# Altium footprint library PcbLib1.PcbLib: 120 footprints (part 2 of 8)
Each footprint in its own frame and in the unit in brackets; x right, y up, seen from the top. Pads: shape width x height; smd on the part's side, far side on the other; paste and mask are expansions set on the pad; w line width, h text height; cw(c..) or ccw(c..) is an arc to the next point about the centre after c.
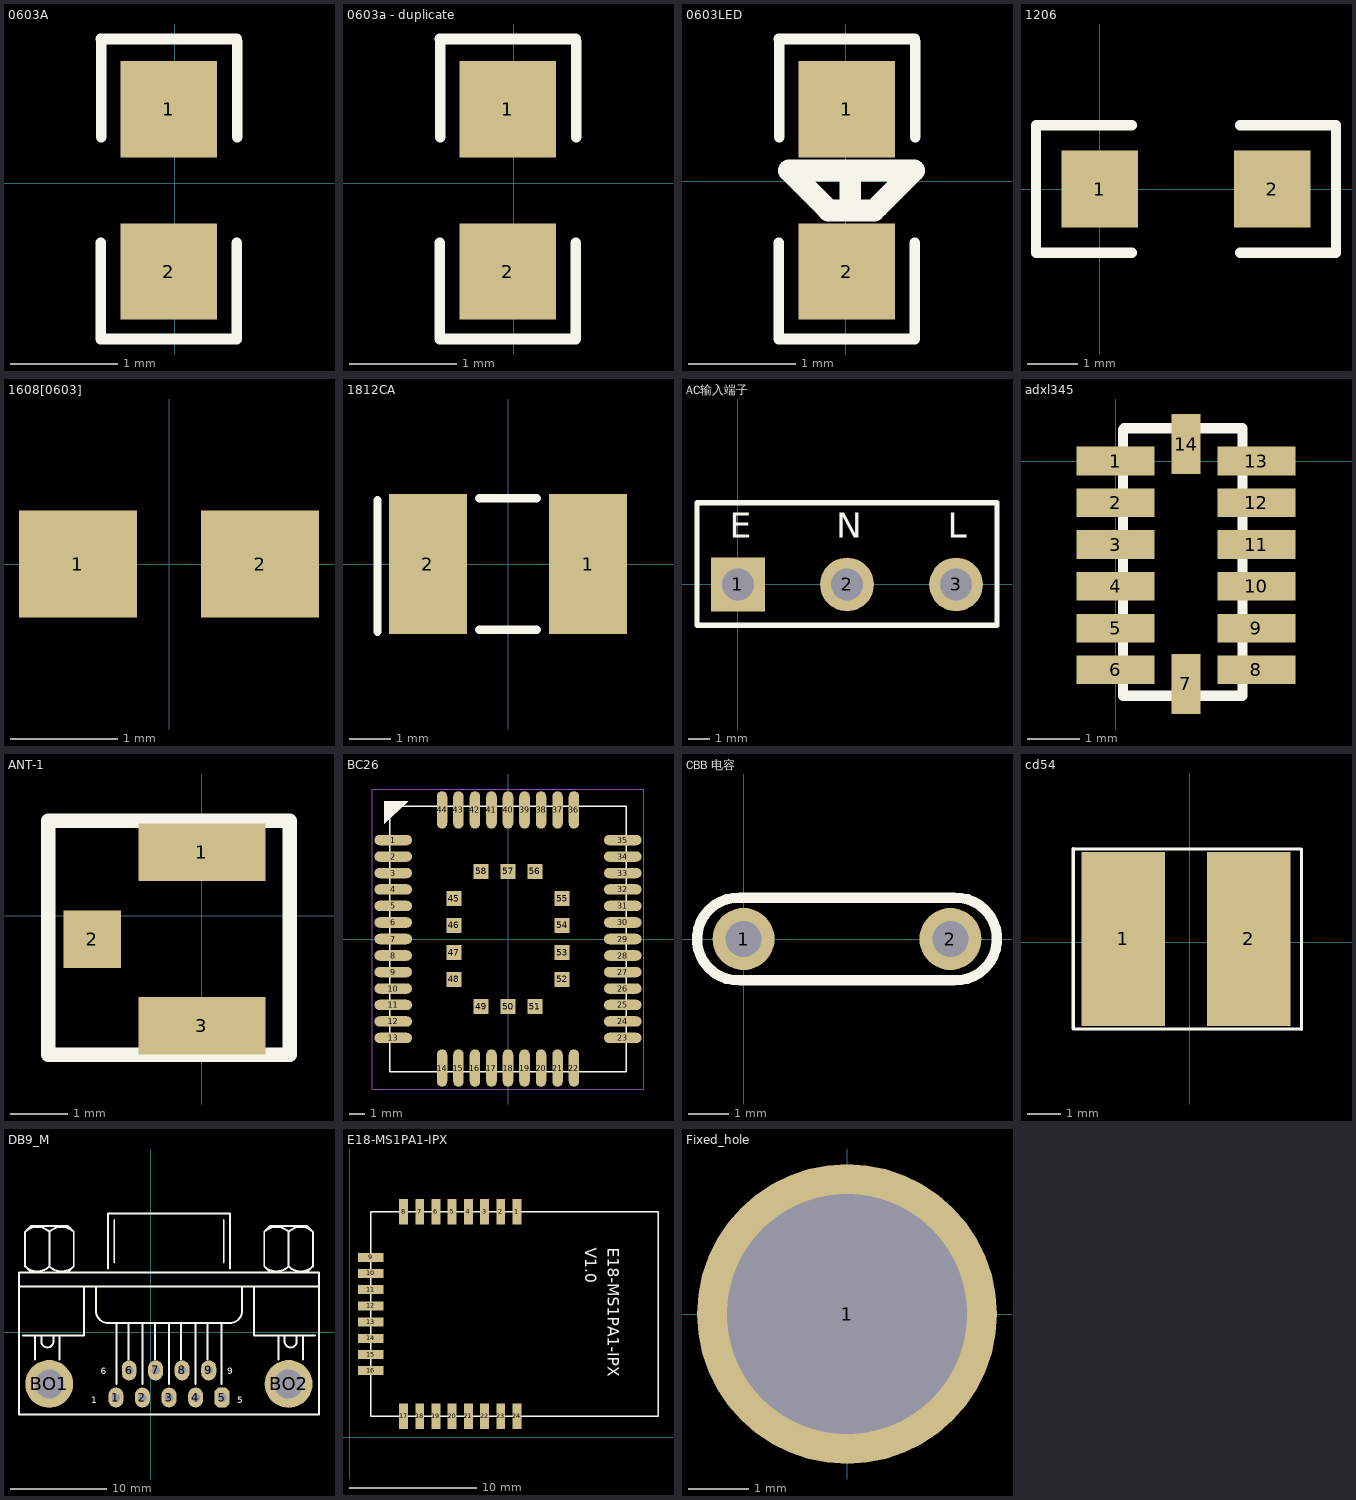
[diagram p1: the footprints below, top view; thin cyan lines are the x and y axes]

## 36W双组输出模块 - duplicate [mm]

## 0603A [mm]
pads (2):
  rect 0.9x0.9 smd: 1(-0.058,0.688) 2(-0.058,-0.826)
Top Overlay:
  lines w0.1: -0.693,-1.446 -0.693,-0.557 ; -0.693,-1.457 0.577,-1.457 ; -0.692,1.345 0.578,1.345 ; -0.689,0.43 -0.689,1.319 ; 0.577,-1.45 0.577,-0.561 ; 0.582,0.43 0.582,1.319

## 0603a - duplicate [mm]
pads (2):
  rect 0.9x0.9 smd: 1(-0.058,0.688) 2(-0.058,-0.826)
Top Overlay:
  lines w0.1: -0.693,-1.446 -0.693,-0.557 ; -0.693,-1.457 0.577,-1.457 ; -0.692,1.345 0.578,1.345 ; -0.689,0.43 -0.689,1.319 ; 0.577,-1.45 0.577,-0.561 ; 0.582,0.43 0.582,1.319

## 0603LED [mm]
pads (2):
  rect 0.9x0.9 smd: 1(0.009,0.673) 2(0.009,-0.842)
Top Overlay:
  lines w0.1: -0.626,-1.462 -0.626,-0.573 ; -0.625,-1.472 0.645,-1.472 ; -0.625,1.329 0.645,1.329 ; -0.621,0.414 -0.621,1.303 ; 0.645,-1.465 0.645,-0.576 ; 0.649,0.414 0.649,1.303
  lines w0.203: -0.175,-0.257 -0.533,0.102 0.639,0.102 0.303,-0.234 ; -0.164,-0.272 0.266,-0.272 ; 0.041,-0.196 0.041,0.023

## 1206 [mil]
pads (2):
  rect 60x60 smd: 1(0,0) 2(135,0)
Top Overlay:
  lines w8: 25,-50 -50,-50 -50,50 25,50 ; 110,-50 185,-50 185,50 110,50

## 1608[0603] [mm] "Chip Capacitor; Body 1.6 x 0.8 mm (LxW typ)"
height 1.35
pads (2):
  rect 1.1x1 smd: 1(-0.85,0) 2(0.85,0)

## 1812CA [mm]
height 1.1
pads (2):
  rect 1.9x3.4 smd: 1(1.95,0) 2(-1.95,0)
Top Overlay:
  lines w0.2: -3.175,-1.651 -3.175,1.549 ; -0.7,-1.6 0.7,-1.6 ; -0.7,1.6 0.7,1.6

## AC输入端子 [mm]
pads (3):
  rect 2.5x2.5 hole 1.5: 1(0,0)
  round 2.5 hole 1.5: 2(5.08,0) 3(10.16,0)
Top Overlay:
  lines w0.254: -1.905,-1.905 12.065,-1.905 12.065,3.81 -1.905,3.81 -1.905,-1.905
  text "E" at -0.381,1.778 h2
  text "L" at 9.779,1.778 h2
  text "N" at 4.572,1.778 h2

## adxl345 [mm]
pads (14):
  rect 1.5x0.55 smd: 1(0,0) 2(0,-0.8) 3(0,-1.6) 4(0,-2.4) 5(0,-3.2) 6(0,-4) 8(2.7,-4) 9(2.7,-3.2) 10(2.7,-2.4) 11(2.7,-1.6) 12(2.7,-0.8) 13(2.7,0)
  rect 0.55x1.15 smd: 7(1.349,-4.27) 14(1.35,0.326)
Top Overlay:
  lines w0.2: 0.144,0.602 0.144,-4.493 2.408,-4.493 ; 0.166,0.625 2.432,0.625 2.432,-4.493

## ANT-1 [mm]
pads (3):
  rect 2.2x1 smd: 1(0,1.1) 3(0,-1.905)
  rect 1x1 smd: 2(-1.905,-0.408)
Top Overlay:
  lines w0.254: -2.667,-2.413 -2.667,1.651 1.524,1.651 1.524,-2.413 -2.667,-2.413

## BC26 [mm]
pads (58):
  oval 2.5x0.7 smd mask+0.05: 1(-7.65,6.6) 2(-7.65,5.5) 3(-7.65,4.4) 4(-7.65,3.3) 5(-7.65,2.2) 6(-7.65,1.1) 7(-7.65,0) 8(-7.65,-1.1) 9(-7.65,-2.2) 10(-7.65,-3.3) 11(-7.65,-4.4) 12(-7.65,-5.5) 13(-7.65,-6.6) 23(7.65,-6.6) 24(7.65,-5.5) 25(7.65,-4.4) 26(7.65,-3.3) 27(7.65,-2.2) 28(7.65,-1.1) 29(7.65,0) 30(7.65,1.1) 31(7.65,2.2) 32(7.65,3.3) 33(7.65,4.4) 34(7.65,5.5) 35(7.65,6.6)
  oval 0.7x2.5 smd mask+0.05: 14(-4.4,-8.6) 15(-3.3,-8.6) 16(-2.2,-8.6) 17(-1.1,-8.6) 18(0,-8.6) 19(1.1,-8.6) 20(2.2,-8.6) 21(3.3,-8.6) 22(4.4,-8.6) 36(4.4,8.6) 37(3.3,8.6) 38(2.2,8.6) 39(1.1,8.6) 40(0,8.6) 41(-1.1,8.6) 42(-2.2,8.6) 43(-3.3,8.6) 44(-4.4,8.6)
  rect 1x1 smd mask+0.05: 45(-3.6,2.7) 46(-3.6,0.9) 47(-3.6,-0.9) 48(-3.6,-2.7) 49(-1.8,-4.5) 50(0,-4.5) 51(1.8,-4.5) 52(3.6,-2.7) 53(3.6,-0.9) 54(3.6,0.9) 55(3.6,2.7) 56(1.8,4.5) 57(0,4.5) 58(-1.8,4.5)
Top Overlay:
  region: -8.25,9.2 -6.641,9.2 -8.25,7.696
  lines w0.1: -7.9,-8.85 -7.9,8.85 7.9,8.85 7.9,-8.85 -7.9,-8.85
Mechanical 1:
  lines w0.01: -9.05,-10 -9.05,10 9.05,10 9.05,-10 -9.05,-10

## CBB 电容 [mil]
pads (2):
  round 60 hole 34.65: 1(0,0) 2(200,0)
Top Overlay:
  lines w10: -3.14,-40 203.04,-40 ; -3.14,-39.96 cw(c-5,0) -3.04,39.95 ; -3.04,40 203.14,40 ; 203.04,-39.95 ccw(c205,0) 203.14,39.96

## cd54 [mm]
pads (2):
  rect 2.5x5.2 smd: 1(-1.992,0.1) 2(1.758,0.1)
Top Overlay:
  lines w0.1: -3.482,-2.585 -3.482,2.794 3.328,2.784 3.328,-2.596 -3.482,-2.585

## DB9_M [mil]
pads (11):
  oval 62x82 hole 35: 1(-144.01,-268.56) 2(-34.85,-268.56) 3(74.32,-268.56) 4(183.49,-268.56) 7(19.32,-156.89) 8(128.49,-156.89) 9(237.65,-156.89)
  oct 62x82 hole 35: 5(292.65,-268.56)
  oval 60x82 hole 35: 6(-89.85,-156.89)
  round 196.67 hole 118.33: BO1(-418.18,-212.73) BO2(565.99,-212.73)
Top Overlay:
  lines w8: -542.35,187.27 690.99,187.27 ; -525.68,-12.73 -275.68,-12.73 -275.68,187.27 ; -517.43,270.52 ccw(c-467.35,320.61) -417.26,270.52 ; -517.43,412.36 cw(c-467.35,362.27) -417.26,412.36 ; -492.35,245.61 -517.35,270.61 -517.35,412.27 -492.35,437.27 -342.35,437.27 -317.35,412.27 -317.35,270.61 -342.35,245.61 ; -475.68,-112.73 -475.68,-12.73 ; -450.68,-12.73 -450.68,-37.73 ccw(c-425.68,-37.73) -400.68,-37.73 -400.68,-12.73 ; -417.43,270.52 ccw(c-367.35,320.61) -317.26,270.52 ; -417.43,412.36 cw(c-367.35,362.27) -317.26,412.36 ; -417.35,270.61 -417.35,412.27 ; -375.68,-112.73 -375.68,-12.73 ; -225.68,187.27 -225.68,87.27 ccw(c-175.68,87.27) -175.68,37.27 324.32,37.27 ccw(c324.32,87.27) 374.32,87.27 374.32,187.27 ; -175.68,262.27 -175.68,487.27 324.32,487.27 324.32,262.27 ; -150.68,287.27 -150.68,462.27 ; -142.35,-212.73 -142.35,37.27 ; -92.35,-112.73 -92.35,37.27 ; -34.01,-212.73 -34.01,37.27 ; 15.99,-112.73 15.99,37.27 ; 74.32,-212.73 74.32,37.27 ; 124.32,-112.73 124.32,37.27 ; 182.65,-212.73 182.65,37.27 ; 232.65,-112.73 232.65,37.27 ; 290.99,-212.73 290.99,37.27 ; 299.32,287.27 299.32,462.27 ; 424.32,187.27 424.32,-12.73 674.32,-12.73 ; 465.9,270.52 ccw(c515.99,320.61) 566.07,270.52 ; 465.9,412.36 cw(c515.99,362.27) 566.07,412.36 ; 490.99,245.61 465.99,270.61 465.99,412.27 490.99,437.27 640.99,437.27 665.99,412.27 665.99,270.61 640.99,245.61 ; 524.32,-112.73 524.32,-12.73 ; 549.32,-12.73 549.32,-37.73 ccw(c574.32,-37.73) 599.32,-37.73 599.32,-12.73 ; 565.9,270.52 ccw(c615.99,320.61) 666.07,270.52 ; 565.9,412.36 cw(c615.99,362.27) 666.07,412.36 ; 565.99,270.61 565.99,412.27 ; 624.32,-112.73 624.32,-12.73 ; -542.35,-337.73 -542.35,245.61 690.99,245.61 690.99,-337.73 -542.35,-337.73
  text "6" at -205.68,-172.73 h27
  text "1" at -245.68,-292.73 h27
  text "5" at 354.32,-292.73 h27
  text "9" at 314.32,-172.73 h27

## E18-MS1PA1-IPX [mm]
pads (24):
  rect 0.7x2 smd: 1(13.109,17.665) 2(11.839,17.665) 3(10.569,17.665) 4(9.299,17.665) 5(8.029,17.665) 6(6.759,17.665) 7(5.489,17.665) 8(4.219,17.665) 17(4.219,1.639) 18(5.489,1.639) 19(6.759,1.639) 20(8.029,1.639) 21(9.299,1.639) 22(10.569,1.639) 23(11.839,1.639) 24(13.109,1.639)
  rect 2x0.7 smd: 9(1.651,14.097) 10(1.651,12.827) 11(1.651,11.557) 12(1.651,10.287) 13(1.651,9.017) 14(1.651,7.747) 15(1.651,6.477) 16(1.651,5.207)
Top Overlay:
  lines w0.1: 1.664,1.652 1.664,17.652 24.164,17.652 24.164,1.652 1.664,1.652
  text "V1.0" at 18.454,14.862 h0.9
  text "E18-MS1PA1-IPX" at 20.224,14.862 h0.9
Bottom Overlay:
  drawing of 774 lines, arcs and shapes, not listed
  text "GND" at 12.894,14.672 h0.55
  text "VCC" at 11.624,14.812 h0.55
  text "P22" at 10.334,14.872 h0.55
  text "P21" at 9.044,15.002 h0.55
  text "P20" at 7.764,14.882 h0.55
  text "P17" at 6.504,14.982 h0.55
  text "P16" at 5.244,14.992 h0.55
  text "NC" at 3.964,15.222 h0.55
  text "P06" at 3.954,3.062 h0.5
  text "P05" at 5.194,3.072 h0.55
  text "P04" at 6.514,3.072 h0.55
  text "P03" at 7.814,3.082 h0.55
  text "P02" at 9.054,3.072 h0.55
  text "P01" at 10.314,3.072 h0.55
  text "P00" at 11.594,3.072 h0.55
  text "RESET" at 12.874,3.072 h0.55
  text "NC" at 4.004,13.802 h0.55
  text "P15" at 4.254,12.542 h0.55
  text "P14" at 4.304,11.262 h0.55
  text "P13" at 4.254,10.002 h0.55
  text "P12" at 4.254,8.722 h0.55
  text "P11" at 4.254,7.482 h0.55
  text "P10" at 4.254,6.172 h0.55
  text "P07" at 4.264,4.972 h0.5

## Fixed_hole [mm] "固定孔"
pads (1):
  round 5 hole 4: 1(0,0)